# Altium footprint library Module.PcbLib: 42 footprints (part 1 of 3)
Each footprint in its own frame and in the unit in brackets; x right, y up, seen from the top. Pads: shape width x height; smd on the part's side, far side on the other; paste and mask are expansions set on the pad; w line width, h text height; cw(c..) or ccw(c..) is an arc to the next point about the centre after c.
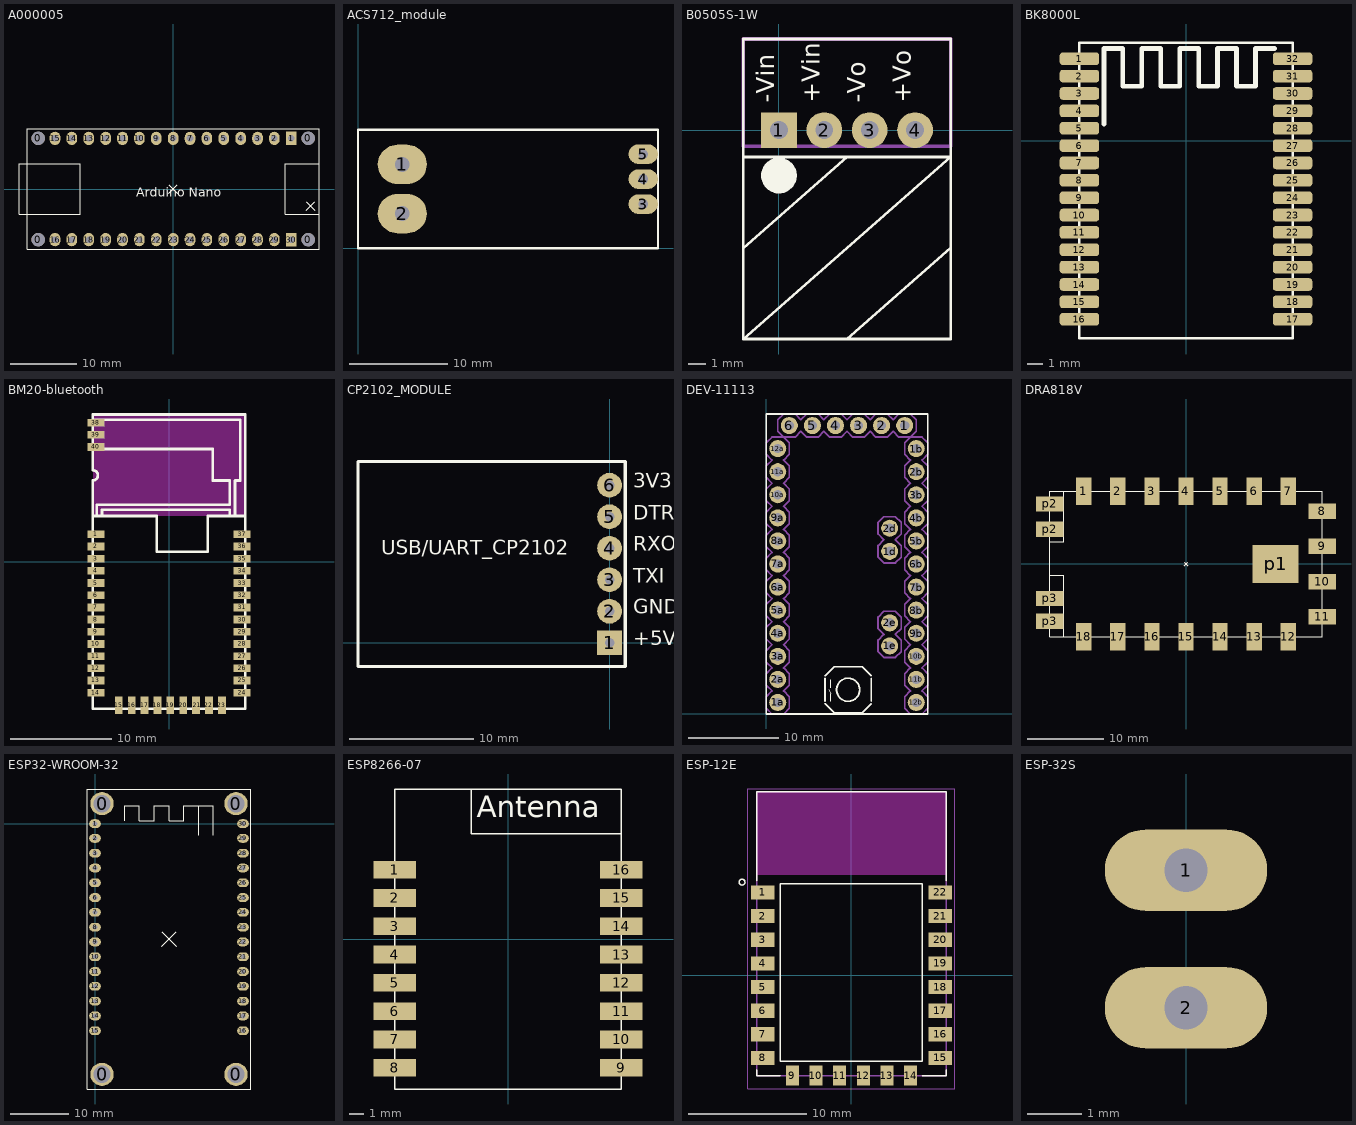
[diagram p0: the footprints below, top view; thin cyan lines are the x and y axes]

## A000005 [mm] "Development Boards & Kits - AVR ARDUINO NANO V3 A000005"
pads (34):
  round 2 hole 2 unplated: 0(-20.32,-7.62) 0(-20.32,7.62) 0(20.32,-7.62) 0(20.32,7.62)
  rect 1.6x2 hole 1: 1(17.78,7.62) 30(17.78,-7.62)
  oval 1.6x2 hole 1: 2(15.24,7.62) 3(12.7,7.62) 4(10.16,7.62) 5(7.62,7.62) 6(5.08,7.62) 7(2.54,7.62) 8(0,7.62) 9(-2.54,7.62) 10(-5.08,7.62) 11(-7.62,7.62) 12(-10.16,7.62) 13(-12.7,7.62) 14(-15.24,7.62) 15(-17.78,7.62) 16(-17.78,-7.62) 17(-15.24,-7.62) 18(-12.7,-7.62) 19(-10.16,-7.62) 20(-7.62,-7.62) 21(-5.08,-7.62) 22(-2.54,-7.62) 23(0,-7.62) 24(2.54,-7.62) 25(5.08,-7.62) 26(7.62,-7.62) 27(10.16,-7.62) 28(12.7,-7.62) 29(15.24,-7.62)
Top Overlay:
  lines w0.1: -0.635,-0.635 0.635,0.635 ; -0.635,0.635 0.635,-0.635 ; 20.045,-3.175 21.315,-1.905 ; 20.045,-1.905 21.315,-3.175 ; -23.2,-3.8 -14,-3.8 -14,3.8 -23.2,3.8 -23.2,-3.8 ; -21.95,-9.1 -21.95,9.1 21.95,9.1 21.95,-9.1 -21.95,-9.1 ; 16.87,-3.81 16.87,3.81 21.95,3.81 21.95,-3.81 16.87,-3.81
  text "Arduino Nano" at -5.547,-1.2 h1.4
3D body "User Library-arduino_nano.STEP": height 12.6, standoff -6, extent -23.389,-8.983 21.611,9.017

## ACS712_module [mm]
pads (5):
  oval 5x4 hole 1.5: 1(4.5,8.5) 2(4.5,3.5)
  oval 3x2 hole 1: 3(29,4.46) 4(29,7) 5(29,9.54)
Top Overlay:
  lines w0.254: 0,0 30.5,0 30.5,12 0,12 0,0
3D body "ACS 712 Stromsensor fur Arduino.step": height 11.5, standoff -1.5, extent 0,0 30.5,12

## ARDUINO_MEGA2560_MINI [mm]
3D body "User Library-ARDUINO_MEGA2560_MINI.STEP": height 76.8, standoff 25.6, extent -17.662,-11.848 18.338,1.752

## ARDUINO_MINI_V1 [mm]
3D body "User Library-ARDUINO_MINI_V1.STEP": height 0, standoff -18.6, extent -9,-13 25,5.6

## ARDUINO_NANO_V3 [mm]
3D body "User Library-ARDUINO_NANO_V3.STEP": height 1.38, standoff -16.62, extent -3.82,-8.5 41.18,10.1

## B0505S-1W [mm]
pads (4):
  rect 2x2 hole 1: 1(0,0)
  round 2 hole 1: 2(2.54,0) 3(5.08,0) 4(7.62,0)
Top Overlay:
  circle w1: c0,-2.54 r0.5
  lines w0.1: -1.99,-0.9 -1.99,5.1 9.61,5.1
  lines w0.15: -1.99,-6.592 3.81,-1.5 ; 3.81,-11.684 9.61,-6.592 ; -1.99,-11.684 9.61,-1.5 ; -1.99,-11.684 -1.99,-1.5 ; -1.99,-11.684 9.61,-11.684 9.61,-1.5 ; -1.99,-1.5 9.61,-1.5 ; -1.99,-1.5 -1.99,5.1 9.61,5.1 9.61,-0.9 9.61,-1.5
  text "+Vo" at 7.366,1.524 h1
  text "-Vin" at -0.254,1.524 h1
  text "+Vin" at 2.286,1.524 h1
  text "-Vo" at 4.826,1.524 h1
Mechanical 13:
  lines w0.2: -1.99,-0.9 9.61,-0.9 9.61,5.1 -1.99,5.1 -1.99,-0.9
3D body "B0505S-1W.stp": height 10.1, standoff -4.16, extent -1.99,-0.9 9.61,5.1

## BK8000L [mm]
pads (32):
  rrect50% 2.5x0.8 smd: 1(-6.75,5.197) 2(-6.75,4.097) 3(-6.75,2.997) 4(-6.75,1.897) 5(-6.75,0.797) 6(-6.75,-0.303) 7(-6.75,-1.403) 8(-6.75,-2.503) 9(-6.75,-3.603) 10(-6.75,-4.703) 11(-6.75,-5.803) 12(-6.75,-6.903) 13(-6.75,-8.003) 14(-6.75,-9.103) 15(-6.75,-10.203) 16(-6.75,-11.303) 17(6.75,-11.303) 18(6.75,-10.203) 19(6.75,-9.103) 20(6.75,-8.003) 21(6.75,-6.903) 22(6.75,-5.803) 23(6.75,-4.703) 24(6.75,-3.603) 25(6.75,-2.503) 26(6.75,-1.403) 27(6.75,-0.303) 28(6.75,0.797) 29(6.75,1.897) 30(6.75,2.997) 31(6.75,4.097) 32(6.75,5.197)
Top Overlay:
  lines w0.15: -6.75,-12.5 -6.75,6.2 6.75,6.2 6.75,-12.5 -6.75,-12.5
  lines w0.3: -5.2,1.05 -5.2,5.85 -4,5.85 -4,3.45 -2.8,3.45 -2.8,5.85 -1.6,5.85 -1.6,3.45 -0.4,3.45 -0.4,5.85 0.8,5.85 0.8,3.45 2,3.45 2,5.85 3.2,5.85 3.2,3.45 4.4,3.45 4.4,5.85 5.6,5.85

## BM20-bluetooth [mm]
pads (40):
  rect 1.7x0.76 smd: 1(-7.2,2.7) 2(-7.2,1.5) 3(-7.2,0.3) 4(-7.2,-0.9) 5(-7.2,-2.1) 6(-7.2,-3.3) 7(-7.2,-4.5) 8(-7.2,-5.7) 9(-7.2,-6.9) 10(-7.2,-8.1) 11(-7.2,-9.3) 12(-7.2,-10.5) 13(-7.2,-11.7) 14(-7.2,-12.9) 24(7.2,-12.9) 25(7.2,-11.7) 26(7.2,-10.5) 27(7.2,-9.3) 28(7.2,-8.1) 29(7.2,-6.9) 30(7.2,-5.7) 31(7.2,-4.5) 32(7.2,-3.3) 33(7.2,-2.1) 34(7.2,-0.9) 35(7.2,0.3) 36(7.2,1.5) 37(7.2,2.7) 38(-7.2,13.7) 39(-7.2,12.5) 40(-7.2,11.3)
  rect 0.76x1.7 smd: 15(-4.95,-14.15) 16(-3.68,-14.15) 17(-2.41,-14.15) 18(-1.14,-14.15) 19(0.13,-14.15) 20(1.4,-14.15) 22(3.94,-14.15) 23(5.21,-14.15) " 21"(2.67,-14.15)
Top Overlay:
  lines w0.254: -7.5,10.8 -7.5,14.5 ; -6.3,14.5 -7.5,14.5 ; 3.8,4.4 3.8,1 -1.2,1 -1.2,4.5 -7.5,4.5 ; 3.8,4.5 7.5,4.5 7.5,14.5 ; 6,4.5 6,5.1 -6.6,5.1 -6.6,4.5 -7.1,4.5 -7.1,5.6 6,5.6 6,8 4.3,8 4.3,11.1 -7.5,11.1 -7.5,14 7,14 7,8 6.5,8 6.5,4.5 ; 7.5,-2.7 7.5,-14.5 ; -7.5,4.5 -7.5,-14.5 7.5,-14.5 ; -7.5,4.5 -7.5,8 ccw(c-7.5,8.5) -7.5,9 -7.5,14.5 ; -7.5,14.5 7.5,14.5 ; 7.5,-14.5 7.5,14.5
Keep-Out Layer:
  rectangle: -7.5,4.5 7.5,14.5
3D body: height 0.6, standoff 0, extent -7.5,-14.5 7.5,14.5
3D body: height 2.5, standoff 0.1, extent -7.5,-14.5 7.5,4.5
3D body: height 0.65, standoff 0.2, extent -7.5,4.5 7,14

## CP2102_MODULE [mm]
pads (6):
  rect 2x2 hole 0.762: 1(0,0)
  round 2 hole 0.762: 2(0,2.54) 3(0,5.08) 4(0,7.62) 5(0,10.16) 6(0,12.7)
Top Overlay:
  lines w0.254: -20.28,-1.905 1.27,-1.905 1.27,14.605 -20.28,14.605 -20.28,-1.905
  text "3V3" at 1.905,12.089 h2
  text "DTR" at 1.905,9.525 h2
  text "RXO" at 1.905,7.009 h2
  text "TXI" at 1.905,4.445 h2
  text "GND" at 1.905,1.929 h2
  text "+5V" at 1.905,-0.611 h2
  text "USB/UART_CP2102" at -18.415,6.704 h2
3D body "10118193-0001lfc.stp": height 4.18, standoff 0.58, extent -21.076,2.422 -15.415,10.278
3D body: height 1.2, standoff 0.25, extent -20.28,-1.905 1.27,14.605

## DEV-11113 [mil]
pads (34):
  round 74 / inner round 60 / far side round 74 hole 40: 1(600,1250) 1a(50,50) 1b(650,1150) 1d(535,705) 1e(535,295) 2(500,1250) 2a(50,150) 2b(650,1050) 2d(535,805) 2e(535,395) 3(400,1250) 3a(50,250) 3b(650,950) 4(300,1250) 4a(50,350) 4b(650,850) 5(200,1250) 5a(50,450) 5b(650,750) 6(100,1250) 6a(50,550) 6b(650,650) 7a(50,650) 7b(650,550) 8a(50,750) 8b(650,450) 9a(50,850) 9b(650,350) 10a(50,950) 10b(650,250) 11a(50,1050) 11b(650,150) 12a(50,1150) 12b(650,50)
Top Overlay:
  circle w8: c355,105 r50
  lines w5: 269.96,105.39 280,87.48 280,55 ; 280,114.06 280,148.9
  lines w8: 255,44.37 294.37,5 415.63,5 455,44.37 ; 255,56.18 255,153.82 ; 255,165.63 294.37,205 415.63,205 455,165.63 ; 455,55 455,153.82 ; 0,0 700,0 700,1300 0,1300 0,0
Mechanical 4:
  region: 660,560 640,560 640,540 660,540
  region: 660,660 640,660 640,640 660,640
  region: 660,760 640,760 640,740 660,740
  region: 660,860 640,860 640,840 660,840
  region: 660,960 640,960 640,940 660,940
  region: 660,1060 640,1060 640,1040 660,1040
  region: 660,1160 640,1160 640,1140 660,1140
  region: 660,460 640,460 640,440 660,440
  region: 660,360 640,360 640,340 660,340
  region: 660,260 640,260 640,240 660,240
  region: 660,160 640,160 640,140 660,140
  region: 660,60 640,60 640,40 660,40
  region: 40,640 60,640 60,660 40,660
  region: 40,540 60,540 60,560 40,560
  region: 40,440 60,440 60,460 40,460
  region: 40,340 60,340 60,360 40,360
  region: 40,240 60,240 60,260 40,260
  region: 40,140 60,140 60,160 40,160
  region: 40,40 60,40 60,60 40,60
  region: 40,740 60,740 60,760 40,760
  region: 40,840 60,840 60,860 40,860
  region: 40,940 60,940 60,960 40,960
  region: 40,1040 60,1040 60,1060 40,1060
  region: 40,1140 60,1140 60,1160 40,1160
  region: 525,795 545,795 545,815 525,815
  region: 525,695 545,695 545,715 525,715
  region: 110,1240 110,1260 90,1260 90,1240
  region: 210,1240 210,1260 190,1260 190,1240
  region: 310,1240 310,1260 290,1260 290,1240
  region: 410,1240 410,1260 390,1260 390,1240
  region: 510,1240 510,1260 490,1260 490,1240
  region: 610,1240 610,1260 590,1260 590,1240
  region: 525,385 545,385 545,405 525,405
  region: 525,285 545,285 545,305 525,305
Mechanical 8:
  drawing of 214 lines, arcs and shapes, not listed

## DHT11-1 [mm]
3D body "User Library-DHT11-1.step": height 6, standoff 0, extent -6.5,-16 6.5,8

## DRA818V [mm]
pads (23):
  rect 2x3.6 smd: 1(-13.35,9.5) 2(-8.9,9.5) 3(-4.45,9.5) 4(0,9.5) 5(4.45,9.5) 6(8.9,9.5) 7(13.35,9.5) 12(13.35,-9.5) 13(8.9,-9.5) 14(4.45,-9.5) 15(0,-9.5) 16(-4.45,-9.5) 17(-8.9,-9.5) 18(-13.35,-9.5)
  rect 3.6x2 smd: 8(17.8,6.9) 9(17.8,2.3) 10(17.8,-2.3) 11(17.8,-6.9) p2(-17.8,4.55) p2(-17.8,7.85) p3(-17.8,-7.5) p3(-17.8,-4.5)
  rect 6x5 smd: p1(11.7,0)
Top Overlay:
  lines w0.1: -17.8,-1.5 -16,-1.5 -16,-9.5 ; -17.8,2.9 -16,2.9 -16,9.5 ; -0.25,-0.25 0.25,0.25 ; -0.25,0.25 0.25,-0.25 ; -17.8,-9.5 -17.8,9.5 17.8,9.5 17.8,-9.5 -17.8,-9.5
3D body: height 2, standoff 0, extent -17.8,-9.5 17.8,9.5

## ESP32-WROOM-32 [mm]
pads (34):
  round 4 hole 3: 0(1.2,-43.06) 0(1.2,3.44) 0(24.2,-43.06) 0(24.2,3.44)
  oval 2x1.5 hole 0.8: 1(0,0) 2(0,-2.54) 3(0,-5.08) 4(0,-7.62) 5(0,-10.16) 6(0,-12.7) 7(0,-15.24) 8(0,-17.78) 9(0,-20.32) 10(0,-22.86) 11(0,-25.4) 12(0,-27.94) 13(0,-30.48) 14(0,-33.02) 15(0,-35.56) 16(25.4,-35.56) 17(25.4,-33.02) 18(25.4,-30.48) 19(25.4,-27.94) 20(25.4,-25.4) 21(25.4,-22.86) 22(25.4,-20.32) 23(25.4,-17.78) 24(25.4,-15.24) 25(25.4,-12.7) 26(25.4,-10.16) 27(25.4,-7.62) 28(25.4,-5.08) 29(25.4,-2.54) 30(25.4,0)
Top Overlay:
  lines w0.1: 5.08,0.51 5.08,3.05 7.62,3.05 7.62,0.51 10.16,0.51 10.16,3.05 12.7,3.05 12.7,0.51 15.24,0.51 15.24,3.05 17.78,3.05 ; 11.43,-21.08 13.97,-18.54 ; 11.43,-18.54 13.97,-21.08 ; 17.78,-2.03 17.78,3.05 ; 20.32,-2.03 20.32,3.05 17.78,3.05 ; -1.3,-45.56 26.7,-45.56 26.7,5.94 -1.3,5.94 -1.3,-45.56
3D body "PLS-1.step": height 23.44, standoff 12, extent -1.27,-1.27 1.27,1.27
3D body "PLS-1.step": height 23.44, standoff 12, extent -1.27,-3.81 1.27,-1.27
3D body "PLS-1.step": height 23.44, standoff 12, extent -1.27,-6.35 1.27,-3.81
3D body "PLS-1.step": height 23.44, standoff 12, extent -1.27,-8.89 1.27,-6.35
3D body "PLS-1.step": height 23.44, standoff 12, extent -1.27,-11.43 1.27,-8.89
3D body "PLS-1.step": height 23.44, standoff 12, extent -1.27,-13.97 1.27,-11.43
3D body "PLS-1.step": height 23.44, standoff 12, extent -1.27,-16.51 1.27,-13.97
3D body "PLS-1.step": height 23.44, standoff 12, extent -1.27,-19.05 1.27,-16.51
3D body "PLS-1.step": height 23.44, standoff 12, extent -1.27,-21.59 1.27,-19.05
3D body "PLS-1.step": height 23.44, standoff 12, extent -1.27,-24.13 1.27,-21.59
3D body "PLS-1.step": height 23.44, standoff 12, extent -1.27,-26.67 1.27,-24.13
3D body "PLS-1.step": height 23.44, standoff 12, extent -1.27,-29.21 1.27,-26.67
3D body "PLS-1.step": height 23.44, standoff 12, extent -1.27,-31.75 1.27,-29.21
3D body "PLS-1.step": height 23.44, standoff 12, extent -1.27,-34.29 1.27,-31.75
3D body "PLS-1.step": height 23.44, standoff 12, extent -1.27,-36.83 1.27,-34.29
3D body "PLS-1.step": height 23.44, standoff 12, extent 24.13,-1.27 26.67,1.27
3D body "PLS-1.step": height 23.44, standoff 12, extent 24.13,-3.81 26.67,-1.27
3D body "PLS-1.step": height 23.44, standoff 12, extent 24.13,-6.35 26.67,-3.81
3D body "PLS-1.step": height 23.44, standoff 12, extent 24.13,-8.89 26.67,-6.35
3D body "PLS-1.step": height 23.44, standoff 12, extent 24.13,-11.43 26.67,-8.89
3D body "PLS-1.step": height 23.44, standoff 12, extent 24.13,-13.97 26.67,-11.43
3D body "PLS-1.step": height 23.44, standoff 12, extent 24.13,-16.51 26.67,-13.97
3D body "PLS-1.step": height 23.44, standoff 12, extent 24.13,-19.05 26.67,-16.51
3D body "PLS-1.step": height 23.44, standoff 12, extent 24.13,-21.59 26.67,-19.05
3D body "PLS-1.step": height 23.44, standoff 12, extent 24.13,-24.13 26.67,-21.59
3D body "PLS-1.step": height 23.44, standoff 12, extent 24.13,-26.67 26.67,-24.13
3D body "PLS-1.step": height 23.44, standoff 12, extent 24.13,-29.21 26.67,-26.67
3D body "PLS-1.step": height 23.44, standoff 12, extent 24.13,-31.75 26.67,-29.21
3D body "PLS-1.step": height 23.44, standoff 12, extent 24.13,-34.29 26.67,-31.75
3D body "PLS-1.step": height 23.44, standoff 12, extent 24.13,-36.83 26.67,-34.29

## ESP8266-07 [mm]
pads (16):
  rect 3x1.25 smd: 1(-8,4.9) 2(-8,2.9) 3(-8,0.9) 4(-8,-1.1) 5(-8,-3.1) 6(-8,-5.1) 7(-8,-7.1) 8(-8,-9.1) 9(8,-9.1) 10(8,-7.1) 11(8,-5.1) 12(8,-3.1) 13(8,-1.1) 14(8,0.9) 15(8,2.9) 16(8,4.9)
Top Overlay:
  lines w0.1: -8.25,-7.1 -8,-7.1 -8,-9.1 -8,-7.6 -8,-6.1 ; -8.25,-5.1 -8,-5.1 ; -8.25,-3.1 -8,-3.1 ; -8.25,-1.1 -8,-1.1 ; -8.25,0.9 -8,0.9 ; -8.25,2.9 -8,2.9 ; -8.25,4.9 -8,4.9 ; -2.6,10.6 -2.6,7.45 8,7.45 ; 8.35,-9.1 8,-9.1 8,-10.6 ; 8,-10.6 -8,-10.6 -8,10.6 8,10.6 8,-10.6
  text "Antenna" at -2.2,8.6 h1.52
3D body "User Library-ESP-07.step": height 3.5, standoff -0.01, extent -7.981,-10.687 8.019,11.313

## ESP-12E [mm]
pads (22):
  rect 2x1.2 smd: 1(-7.5,7) 2(-7.5,5) 3(-7.5,3) 4(-7.5,1) 5(-7.5,-1) 6(-7.5,-3) 7(-7.5,-5) 8(-7.5,-7) 15(7.5,-7) 16(7.5,-5) 17(7.5,-3) 18(7.5,-1) 19(7.5,1) 20(7.5,3) 21(7.5,5) 22(7.5,7)
  rect 1.1x1.7 smd: 9(-5,-8.5) 10(-3,-8.5) 11(-1,-8.5) 12(1,-8.5) 13(3,-8.5) 14(5,-8.5)
Top Overlay:
  circle w0.127: c-9.25,7.875 r0.25
  lines w0.127: -8,-8 -8,-8.5 -6,-8.5 ; -8,8 -8,15.5 8,15.5 8,8 ; 6,-8.5 8,-8.5 8,-8 ; -6,-7.26 6,-7.26 6,7.74 -6,7.74 -6,-7.26
Keep-Out Layer:
  region: 8,8.51 -8.009,8.51 -8.009,15.5 8,15.5
  region: 8,8.51 -8.009,8.51 -8.009,15.5 8,15.5
Mechanical 13:
  lines w0.127: -8,-8.5 8,-8.5 8,15.5 -8,15.5 -8,-8.5
Mechanical 15:
  lines w0.05: -8.75,-9.625 8.75,-9.625 8.75,15.75 -8.75,15.75 -8.75,-9.625
3D body "User Library-EPS8266 ESP-12E.step": height 2.65, standoff -0.04, extent -8.005,-8.576 8.005,15.429

## ESP-32S [mm]
pads (2):
  oval 3x1.5 hole 0.8: 1(0,-2.54) 2(0,-5.08)
3D body "User Library-Goouuu-ESP32 Development Board.step": height 12.6, standoff -0.54, extent -1.27,-53.04 26.67,2.54